# Altium footprint library CMR_ICs.PcbLib: 68 footprints (part 3 of 5)
Each footprint in its own frame and in the unit in brackets; x right, y up, seen from the top. Pads: shape width x height; smd on the part's side, far side on the other; paste and mask are expansions set on the pad; w line width, h text height; cw(c..) or ccw(c..) is an arc to the next point about the centre after c.
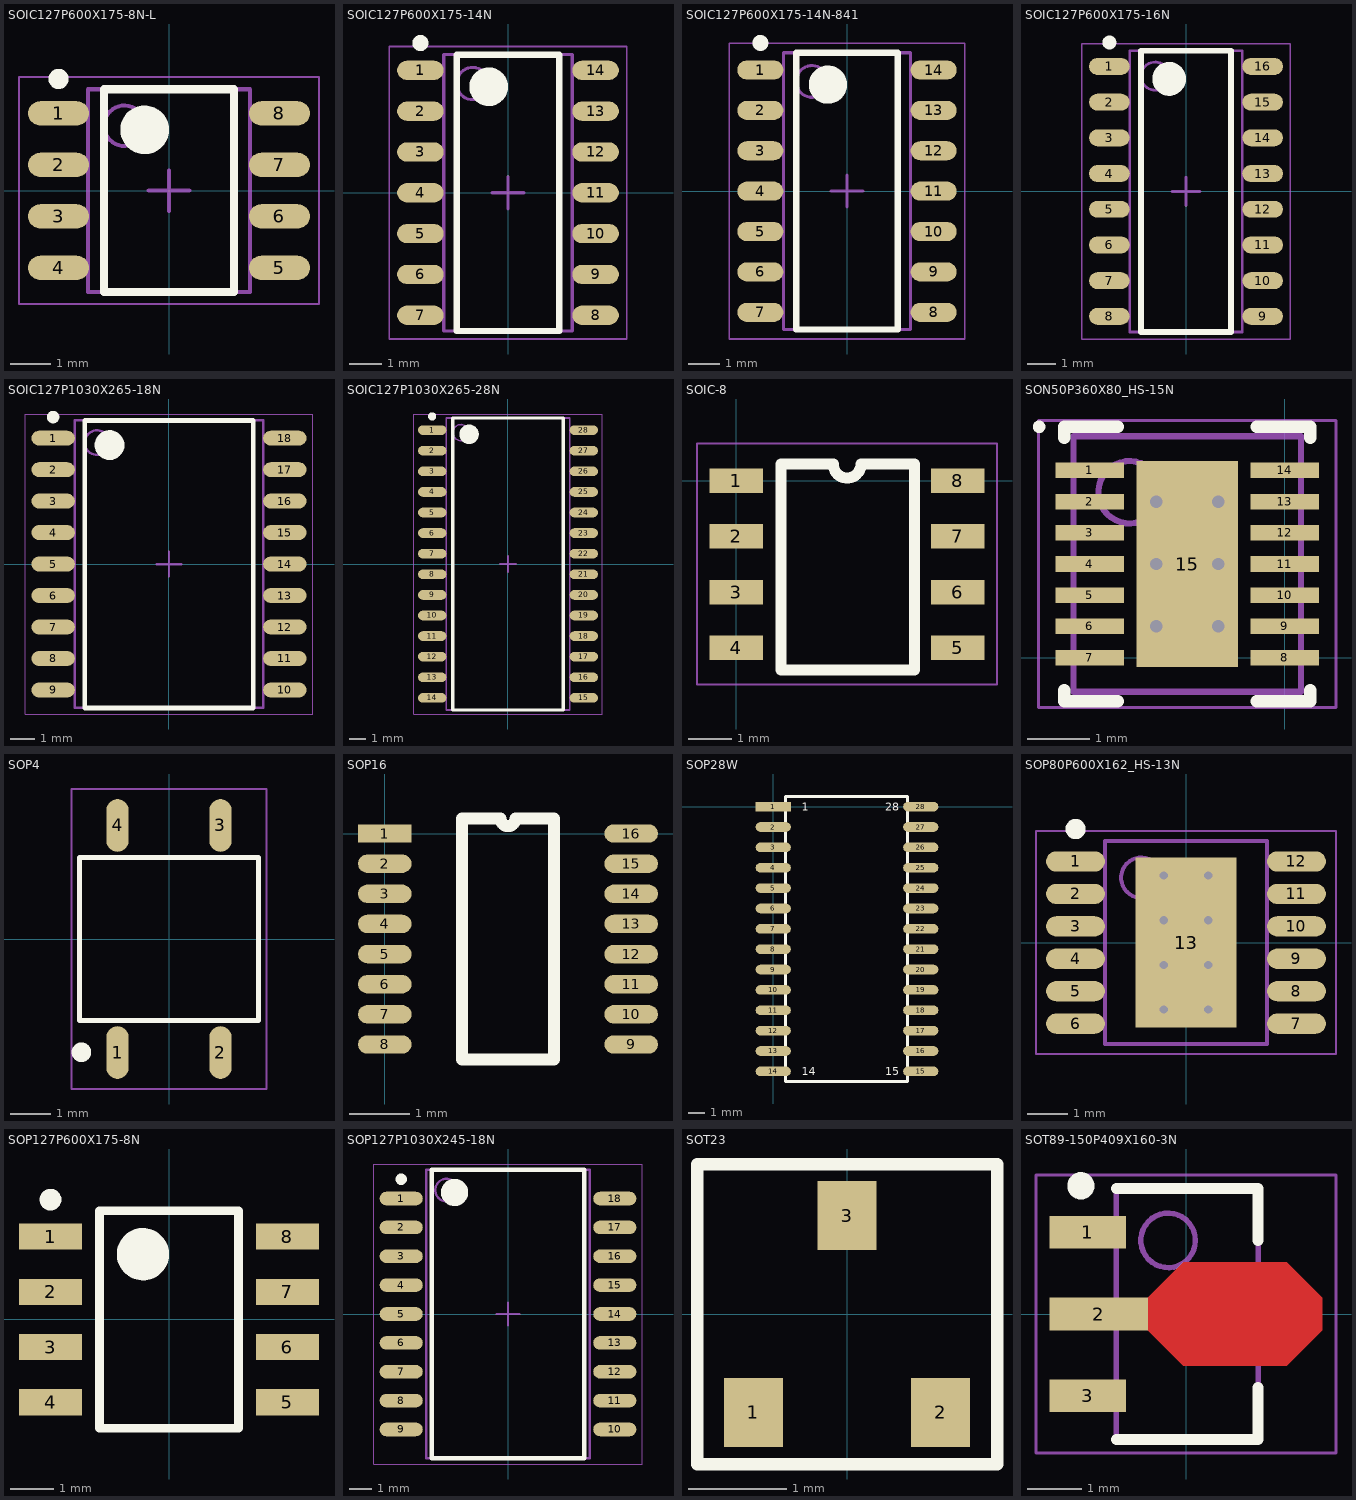
[diagram p2: the footprints below, top view; thin cyan lines are the x and y axes]

## SOIC127P600X175-8N-L [mm] "SOIC, 8-Leads, Body 4.90x3.90mm, Pitch 1.27mm, IPC Medium Density"
height 1.76
pads (8):
  oval 1.5x0.6 smd: 1(-2.725,1.905) 2(-2.725,0.635) 3(-2.725,-0.635) 4(-2.725,-1.905) 5(2.725,-1.905) 6(2.725,-0.635) 7(2.725,0.635) 8(2.725,1.905)
Top Overlay:
  circle w0.6: c-0.6,1.5 r0.3
  circle w0.25: c-2.725,2.755 r0.125
  lines w0.2: -1.6,-2.5 1.6,-2.5 1.6,2.5 -1.6,2.5 -1.6,-2.5
Mechanical 13:
  circle w0.1: c-1.1,1.6 r0.5
  lines w0.1: -2,-2.5 2,-2.5 2,2.5 -2,2.5 -2,-2.5
Mechanical 15:
  lines w0.05: -3.7,-2.8 3.7,-2.8 3.7,2.8 -3.7,2.8 -3.7,-2.8
  lines w0.1: -0.5,0 0.5,0 ; 0,-0.5 0,0.5
3D body "SOIC127P600X175-8N.step": height 1.75, standoff 0, extent -2.997,-2.5 2.997,2.5

## SOIC127P600X175-14N [mm] "SOIC, 14-Leads, Body 8.65x3.90mm, Pitch 1.27mm, IPC Medium Density"
height 1.75
pads (14):
  oval 1.45x0.6 smd: 1(-2.725,3.81) 2(-2.725,2.54) 3(-2.725,1.27) 4(-2.725,0) 5(-2.725,-1.27) 6(-2.725,-2.54) 7(-2.725,-3.81) 8(2.725,-3.81) 9(2.725,-2.54) 10(2.725,-1.27) 11(2.725,0) 12(2.725,1.27) 13(2.725,2.54) 14(2.725,3.81)
Top Overlay:
  circle w0.6: c-0.6,3.3 r0.3
  circle w0.25: c-2.725,4.66 r0.125
  lines w0.2: -1.6,-4.3 1.6,-4.3 1.6,4.3 -1.6,4.3 -1.6,-4.3
Mechanical 13:
  circle w0.1: c-1.1,3.4 r0.5
  lines w0.1: -2,-4.3 2,-4.3 2,4.3 -2,4.3 -2,-4.3
Mechanical 15:
  lines w0.05: -3.7,-4.55 3.7,-4.55 3.7,4.55 -3.7,4.55 -3.7,-4.55
  lines w0.1: -0.5,0 0.5,0 ; 0,-0.5 0,0.5
3D body: height 1.75, standoff 0.1, extent -2,-4.3 2,4.3

## SOIC127P600X175-14N-841 [mm] "SOIC, 14-Leads, Body 8.65x3.90mm, Pitch 1.27mm, IPC Medium Density"
height 1.75
pads (14):
  oval 1.45x0.6 smd: 1(-2.725,3.81) 2(-2.725,2.54) 3(-2.725,1.27) 4(-2.725,0) 5(-2.725,-1.27) 6(-2.725,-2.54) 7(-2.725,-3.81) 8(2.725,-3.81) 9(2.725,-2.54) 10(2.725,-1.27) 11(2.725,0) 12(2.725,1.27) 13(2.725,2.54) 14(2.725,3.81)
Top Overlay:
  circle w0.25: c-2.725,4.66 r0.125
  circle w0.6: c-0.6,3.35 r0.3
  lines w0.2: -1.6,-4.35 -1.6,4.35 1.6,4.35 1.6,-4.35 -1.6,-4.35
Mechanical 13:
  circle w0.1: c-1.1,3.45 r0.5
  lines w0.1: -2,-4.35 -2,4.35 2,4.35 2,-4.35 -2,-4.35
Mechanical 15:
  lines w0.05: -3.7,-4.65 -3.7,4.65 3.7,4.65 3.7,-4.65 -3.7,-4.65
  lines w0.1: -0.5,0 0.5,0 ; 0,-0.5 0,0.5
3D body "SOIC127P600X175-14N-841.step": height 1.75, standoff 0, extent -2.997,-4.35 2.997,4.35

## SOIC127P600X175-16N [mm] "SOIC, 16-Leads, Body 9.90x3.90mm, Pitch 1.27mm, IPC Medium Density"
height 1.75
pads (16):
  oval 1.45x0.6 smd: 1(-2.725,4.445) 2(-2.725,3.175) 3(-2.725,1.905) 4(-2.725,0.635) 5(-2.725,-0.635) 6(-2.725,-1.905) 7(-2.725,-3.175) 8(-2.725,-4.445) 9(2.725,-4.445) 10(2.725,-3.175) 11(2.725,-1.905) 12(2.725,-0.635) 13(2.725,0.635) 14(2.725,1.905) 15(2.725,3.175) 16(2.725,4.445)
Top Overlay:
  circle w0.25: c-2.725,5.295 r0.125
  circle w0.6: c-0.6,4 r0.3
  lines w0.2: -1.6,-5 -1.6,5 1.6,5 1.6,-5 -1.6,-5
Mechanical 13:
  circle w0.1: c-1.1,4.1 r0.5
  lines w0.1: -2,-5 -2,5 2,5 2,-5 -2,-5
Mechanical 15:
  lines w0.05: -3.7,-5.25 -3.7,5.25 3.7,5.25 3.7,-5.25 -3.7,-5.25
  lines w0.1: -0.5,0 0.5,0 ; 0,-0.5 0,0.5
3D body: height 1.75, standoff 0.1, extent -2,-5 2,5

## SOIC127P1030X265-18N [mm] "SOIC, 18-Leads, Body 11.55x7.50mm, Pitch 1.27mm, IPC Medium Density"
height 2.65
pads (18):
  oval 1.75x0.6 smd: 1(-4.675,5.08) 2(-4.675,3.81) 3(-4.675,2.54) 4(-4.675,1.27) 5(-4.675,0) 6(-4.675,-1.27) 7(-4.675,-2.54) 8(-4.675,-3.81) 9(-4.675,-5.08) 10(4.675,-5.08) 11(4.675,-3.81) 12(4.675,-2.54) 13(4.675,-1.27) 14(4.675,0) 15(4.675,1.27) 16(4.675,2.54) 17(4.675,3.81) 18(4.675,5.08)
Top Overlay:
  circle w0.25: c-4.675,5.93 r0.125
  circle w0.6: c-2.4,4.8 r0.3
  lines w0.2: -3.4,-5.8 -3.4,5.8 3.4,5.8 3.4,-5.8 -3.4,-5.8
Mechanical 13:
  circle w0.1: c-2.9,4.9 r0.5
  lines w0.1: -3.8,-5.8 -3.8,5.8 3.8,5.8 3.8,-5.8 -3.8,-5.8
Mechanical 15:
  lines w0.05: -5.8,-6.05 -5.8,6.05 5.8,6.05 5.8,-6.05 -5.8,-6.05
  lines w0.1: -0.5,0 0.5,0 ; 0,-0.5 0,0.5
3D body "SOIC127P1030X265-18N.step": height 2.65, standoff 0, extent -5.15,-5.8 5.15,5.8

## SOIC127P1030X265-28N [mm] "SOIC, 28-Leads, Body 17.90x7.50mm, Pitch 1.27mm, IPC Medium Density"
height 2.65
pads (28):
  oval 1.75x0.6 smd: 1(-4.675,8.255) 2(-4.675,6.985) 3(-4.675,5.715) 4(-4.675,4.445) 5(-4.675,3.175) 6(-4.675,1.905) 7(-4.675,0.635) 8(-4.675,-0.635) 9(-4.675,-1.905) 10(-4.675,-3.175) 11(-4.675,-4.445) 12(-4.675,-5.715) 13(-4.675,-6.985) 14(-4.675,-8.255) 15(4.675,-8.255) 16(4.675,-6.985) 17(4.675,-5.715) 18(4.675,-4.445) 19(4.675,-3.175) 20(4.675,-1.905) 21(4.675,-0.635) 22(4.675,0.635) 23(4.675,1.905) 24(4.675,3.175) 25(4.675,4.445) 26(4.675,5.715) 27(4.675,6.985) 28(4.675,8.255)
Top Overlay:
  circle w0.25: c-4.675,9.105 r0.125
  circle w0.6: c-2.4,8 r0.3
  lines w0.2: -3.4,-9 -3.4,9 3.4,9 3.4,-9 -3.4,-9
Mechanical 13:
  circle w0.1: c-2.9,8.1 r0.5
  lines w0.1: -3.8,-9 -3.8,9 3.8,9 3.8,-9 -3.8,-9
Mechanical 15:
  lines w0.05: -5.8,-9.25 -5.8,9.25 5.8,9.25 5.8,-9.25 -5.8,-9.25
  lines w0.1: -0.5,0 0.5,0 ; 0,-0.5 0,0.5
3D body "SOIC127P1030X265-28N.step": height 2.65, standoff 0, extent -5.15,-9 5.15,9

## SOIC-8 [mil]
pads (8):
  rect 48x22 smd: 1(0,0) 2(0,-50) 3(0,-100) 4(0,-150) 5(199,-150) 6(199,-100) 7(199,-50) 8(199,0)
Top Overlay:
  lines w10: 40,-170 160,-170 160,15 112,15 cw(c99.5,15) 87,15 40,15 40,-170
Mechanical 15:
  lines w1.97: -35.43,-183.07 -35.43,33.46 234.25,33.46 234.25,-183.07 -35.43,-183.07
3D body "SOIC-8_SI.stp": height 69.01, standoff 0, extent -22.49,-172.99 221.51,23.01

## SON50P360X80_HS-15N [mm] "SON, 14-Leads, Body 4.00x3.60mm, Pitch 0.50mm, Thermal Pad 3.30x1.63mm, IPC Medium Density"
height 0.8
pads (15):
  rect 1.1x0.25 smd: 1(-3.13,3) 2(-3.13,2.5) 3(-3.13,2) 4(-3.13,1.5) 5(-3.13,1) 6(-3.13,0.5) 7(-3.13,0) 8(0,0) 9(0,0.5) 10(0,1) 11(0,1.5) 12(0,2) 13(0,2.5) 14(0,3)
  rect 1.63x3.3 smd paste-0.815: 15(-1.565,1.5)
via -1.065,0.5 diameter 0.5 hole 0.2
via -2.065,0.5 diameter 0.5 hole 0.2
via -1.065,1.5 diameter 0.5 hole 0.2
via -2.065,1.5 diameter 0.5 hole 0.2
via -1.065,2.5 diameter 0.5 hole 0.2
via -2.065,2.5 diameter 0.5 hole 0.2
Top Overlay:
  circle w0.1: c-3.94,3.7 r0.05
  lines w0.2: -3.54,-0.525 -3.54,-0.7 -2.68,-0.7 ; -3.54,3.525 -3.54,3.7 -2.68,3.7 ; -0.45,-0.7 0.41,-0.7 0.41,-0.525 ; -0.45,3.7 0.41,3.7 0.41,3.525
Top Paste:
  rectangle: -2.065,0.2 -1.065,2.8
Mechanical 13:
  circle w0.1: c-2.49,2.65 r0.5
  lines w0.1: -3.39,-0.55 0.26,-0.55 0.26,3.55 -3.39,3.55 -3.39,-0.55
Mechanical 15:
  lines w0.05: -3.95,-0.8 0.82,-0.8 0.82,3.8 -3.95,3.8 -3.95,-0.8
  lines w0.1: -2.065,1.5 -1.065,1.5 ; -1.565,1 -1.565,2
3D body "SON50P360X80_HS-15N.step": height 0.8, standoff 0, extent -3.49,-0.55 0.36,3.55

## SOP4 [mm] "used for CPC1117N NC SSR"
height 2.184
pads (4):
  oval 0.551x1.3 smd paste+0 mask+0.076: 1(-1.27,-2.8)
  oval 0.551x1.3 smd mask+0.076: 2(1.27,-2.8) 3(1.27,2.8) 4(-1.27,2.8)
Top Overlay:
  circle w0.254: c-2.159,-2.794 r0.114
  lines w0.127: -2.21,-2.007 -2.21,2.007 2.21,2.007 2.21,-2.007 -2.21,-2.007
Mechanical 15:
  lines w0.05: -2.4,-3.7 -2.4,3.7 -1.25,3.7 2.4,3.7 2.4,-3.7 -2.4,-3.7
3D body: height 2.18, standoff 0.06, extent -2.146,-1.943 2.146,1.943
3D body: height 2.19, standoff 0.51, extent -1.778,-1.524 -1.27,-1.016
3D body: height 1.22, standoff 1.02, extent -1.46,-2.413 -1.079,-1.905
3D body: height 1.22, standoff 0, extent -1.46,-2.54 -1.079,-2.286
3D body: height 0.2, standoff 0, extent -1.46,-3.175 -1.079,-2.54
3D body: height 0.2, standoff 0, extent 1.08,-3.175 1.461,-2.54
3D body: height 1.22, standoff 0, extent 1.08,-2.54 1.461,-2.286
3D body: height 1.22, standoff 1.02, extent 1.08,-2.413 1.461,-1.905
3D body: height 0.2, standoff 0, extent 1.079,2.54 1.46,3.175
3D body: height 1.22, standoff 0, extent 1.079,2.286 1.46,2.54
3D body: height 1.22, standoff 1.02, extent 1.079,1.905 1.46,2.413
3D body: height 0.2, standoff 0, extent -1.461,2.54 -1.08,3.175
3D body: height 1.22, standoff 0, extent -1.461,2.286 -1.08,2.54
3D body: height 1.22, standoff 1.02, extent -1.461,1.905 -1.08,2.413

## SOP16 [mm]
pads (16):
  rect 0.889x0.305 smd: 1(0,0)
  oval 0.889x0.305 smd: 2(0,-0.5) 3(0,-1) 4(0,-1.5) 5(0,-2) 6(0,-2.5) 7(0,-3) 8(0,-3.5) 9(4.09,-3.5) 10(4.09,-3) 11(4.09,-2.5) 12(4.09,-2) 13(4.09,-1.5) 14(4.09,-1) 15(4.09,-0.5) 16(4.09,0)
Top Overlay:
  lines w0.2: 1.279,-3.75 1.279,0.25 1.92,0.25 ccw(c2.045,0.25) 2.17,0.25 2.81,0.25 2.81,-3.75 1.279,-3.75

## SOP28W [mm]
pads (28):
  rect 2.2x0.6 smd: 1(0,0)
  oval 2.2x0.6 smd: 2(0,-1.27) 3(0,-2.54) 4(0,-3.81) 5(0,-5.08) 6(0,-6.35) 7(0,-7.62) 8(0,-8.89) 9(0,-10.16) 10(0,-11.43) 11(0,-12.7) 12(0,-13.97) 13(0,-15.24) 14(0,-16.51) 15(9.2,-16.51) 16(9.2,-15.24) 17(9.2,-13.97) 18(9.2,-12.7) 19(9.2,-11.43) 20(9.2,-10.16) 21(9.2,-8.89) 22(9.2,-7.62) 23(9.2,-6.35) 24(9.2,-5.08) 25(9.2,-3.81) 26(9.2,-2.54) 27(9.2,-1.27) 28(9.2,0)
Top Overlay:
  lines w0.2: 0.762,-17.145 8.382,-17.145 8.382,0.635 0.762,0.635 0.762,-17.145
  text "1" at 1.778,-0.254 h0.5
  text "14" at 1.778,-16.764 h0.5
  text "15" at 6.985,-16.764 h0.5
  text "28" at 6.985,-0.254 h0.5
3D body "SOIC28 wide.stp": height 2, standoff 0, extent -0.51,-17.318 9.654,0.762

## SOP80P600X162_HS-13N [mm] "SOP, 12-Leads, Body 4.90x3.90mm, Pitch 0.80mm, Thermal Pad 4.20x2.50mm, IPC Medium Density"
height 1.62
pads (13):
  oval 1.45x0.5 smd: 1(-2.725,2) 2(-2.725,1.2) 3(-2.725,0.4) 4(-2.725,-0.4) 5(-2.725,-1.2) 6(-2.725,-2) 7(2.725,-2) 8(2.725,-1.2) 9(2.725,-0.4) 10(2.725,0.4) 11(2.725,1.2) 12(2.725,2)
  rect 2.5x4.2 smd: 13(0,0)
via -0.55,1.65 diameter 0.5 hole 0.2
via 0.55,1.65 diameter 0.5 hole 0.2
via -0.55,0.55 diameter 0.5 hole 0.2
via 0.55,0.55 diameter 0.5 hole 0.2
via -0.55,-0.55 diameter 0.5 hole 0.2
via 0.55,-0.55 diameter 0.5 hole 0.2
via -0.55,-1.65 diameter 0.5 hole 0.2
via 0.55,-1.65 diameter 0.5 hole 0.2
Top Overlay:
  circle w0.25: c-2.725,2.8 r0.125
Mechanical 13:
  circle w0.1: c-1.1,1.6 r0.5
  lines w0.1: -2,-2.5 -2,2.5 2,2.5 2,-2.5 -2,-2.5
Mechanical 15:
  lines w0.05: -3.7,-2.75 -3.7,2.75 3.7,2.75 3.7,-2.75 -3.7,-2.75
  lines w0.1: -0.5,0 0.5,0 ; 0,-0.5 0,0.5
3D body: height 1.62, standoff 0.1, extent -2,-2.5 2,2.5

## SOP127P600X175-8N [mm] "SOP, 8-Leads, Body 4.90x3.90mm, Pitch 1.27mm, IPC Medium Density"
height 1.75
pads (8):
  rect 1.45x0.6 smd: 1(-2.725,1.905) 2(-2.725,0.635) 3(-2.725,-0.635) 4(-2.725,-1.905) 5(2.725,-1.905) 6(2.725,-0.635) 7(2.725,0.635) 8(2.725,1.905)
Top Overlay:
  circle w0.25: c-2.725,2.755 r0.125
  circle w0.6: c-0.6,1.5 r0.3
  lines w0.2: -1.6,-2.5 -1.6,2.5 1.6,2.5 1.6,-2.5 -1.6,-2.5
3D body: height 1.75, standoff 0.1, extent -2,-2.5 2,2.5

## SOP127P1030X245-18N [mm] "SOP, 18-Leads, Body 12.50x7.00mm, Pitch 1.27mm, IPC Medium Density"
height 2.45
pads (18):
  oval 1.9x0.6 smd: 1(-4.7,5.08) 2(-4.7,3.81) 3(-4.7,2.54) 4(-4.7,1.27) 5(-4.7,0) 6(-4.7,-1.27) 7(-4.7,-2.54) 8(-4.7,-3.81) 9(-4.7,-5.08) 10(4.7,-5.08) 11(4.7,-3.81) 12(4.7,-2.54) 13(4.7,-1.27) 14(4.7,0) 15(4.7,1.27) 16(4.7,2.54) 17(4.7,3.81) 18(4.7,5.08)
Top Overlay:
  circle w0.6: c-2.35,5.35 r0.3
  circle w0.25: c-4.7,5.93 r0.125
  lines w0.2: -3.35,-6.35 3.35,-6.35 3.35,6.35 -3.35,6.35 -3.35,-6.35
Mechanical 13:
  circle w0.1: c-2.7,5.45 r0.5
  lines w0.1: -3.6,-6.35 3.6,-6.35 3.6,6.35 -3.6,6.35 -3.6,-6.35
Mechanical 15:
  lines w0.05: -5.9,-6.6 5.9,-6.6 5.9,6.6 -5.9,6.6 -5.9,-6.6
  lines w0.1: -0.5,0 0.5,0 ; 0,-0.5 0,0.5
3D body "SOP127P1030X245-18N.step": height 2.45, standoff 0, extent -5.15,-6.35 5.15,6.35

## SOT23 [mm] "used with BAT54C diode array"
height 1.1
pads (3):
  rect 0.6x0.7 smd paste+0: 1(-0.95,-1) 2(0.95,-1) 3(0,1)
Top Overlay:
  lines w0.127: -1.524,-1.524 -1.524,1.524 1.524,1.524 1.524,-1.524 -1.524,-1.524
3D body: height 0.15, standoff 0, extent -0.25,0.937 0.25,1.275
3D body: height 0.5, standoff 0, extent -0.25,0.812 0.25,0.937
3D body: height 0.5, standoff 0.35, extent -0.25,0.687 0.25,0.812
3D body: height 0.15, standoff 0, extent 0.7,-1.275 1.2,-0.937
3D body: height 0.5, standoff 0, extent 0.7,-0.937 1.2,-0.812
3D body: height 0.5, standoff 0.35, extent 0.7,-0.812 1.2,-0.687
3D body: height 1.1, standoff 0.1, extent -1.5,-0.7 1.5,0.7
3D body: height 0.5, standoff 0.35, extent -1.2,-0.812 -0.7,-0.687
3D body: height 0.5, standoff 0, extent -1.2,-0.937 -0.7,-0.812
3D body: height 0.15, standoff 0, extent -1.2,-1.275 -0.7,-0.937

## SOT89-150P409X160-3N [mm] "SOT89, 3-Leads, Body 4.50x2.45mm, Pitch 1.50mm, Lead Span 4.1mm, IPC Medium Density"
height 1.6
pads (3):
  rect 1.4x0.6 smd: 1(-1.8,1.5) 3(-1.8,-1.5)
  rect 1.8x0.6 smd: 2(-1.6,0)
Top Layer:
  region: -0.7,0.3 -0.05,0.95 1.85,0.95 2.5,0.3 2.5,-0.3 1.85,-0.95 -0.05,-0.95 -0.7,-0.3
Top Overlay:
  circle w0.25: c-1.927,2.35 r0.125
  lines w0.2: -1.278,-2.3 1.322,-2.3 1.322,-1.35 ; -1.278,2.3 1.322,2.3 1.322,1.35
Mechanical 13:
  circle w0.1: c-0.327,1.35 r0.5
  lines w0.1: -1.278,-2.3 1.322,-2.3 1.322,2.3 -1.278,2.3 -1.278,-2.3
Mechanical 15:
  lines w0.05: -2.75,-2.55 2.75,-2.55 2.75,2.55 -2.75,2.55 -2.75,-2.55
  lines w0.1: -0.477,0 0.523,0 ; 0.022,-0.5 0.022,0.5
3D body: height 1.6, standoff 0, extent -1.278,-2.3 1.322,2.3